# Altium footprint library S61.PcbLib: 50 footprints (part 3 of 4)
Each footprint in its own frame and in the unit in brackets; x right, y up, seen from the top. Pads: shape width x height; smd on the part's side, far side on the other; paste and mask are expansions set on the pad; w line width, h text height; cw(c..) or ccw(c..) is an arc to the next point about the centre after c.
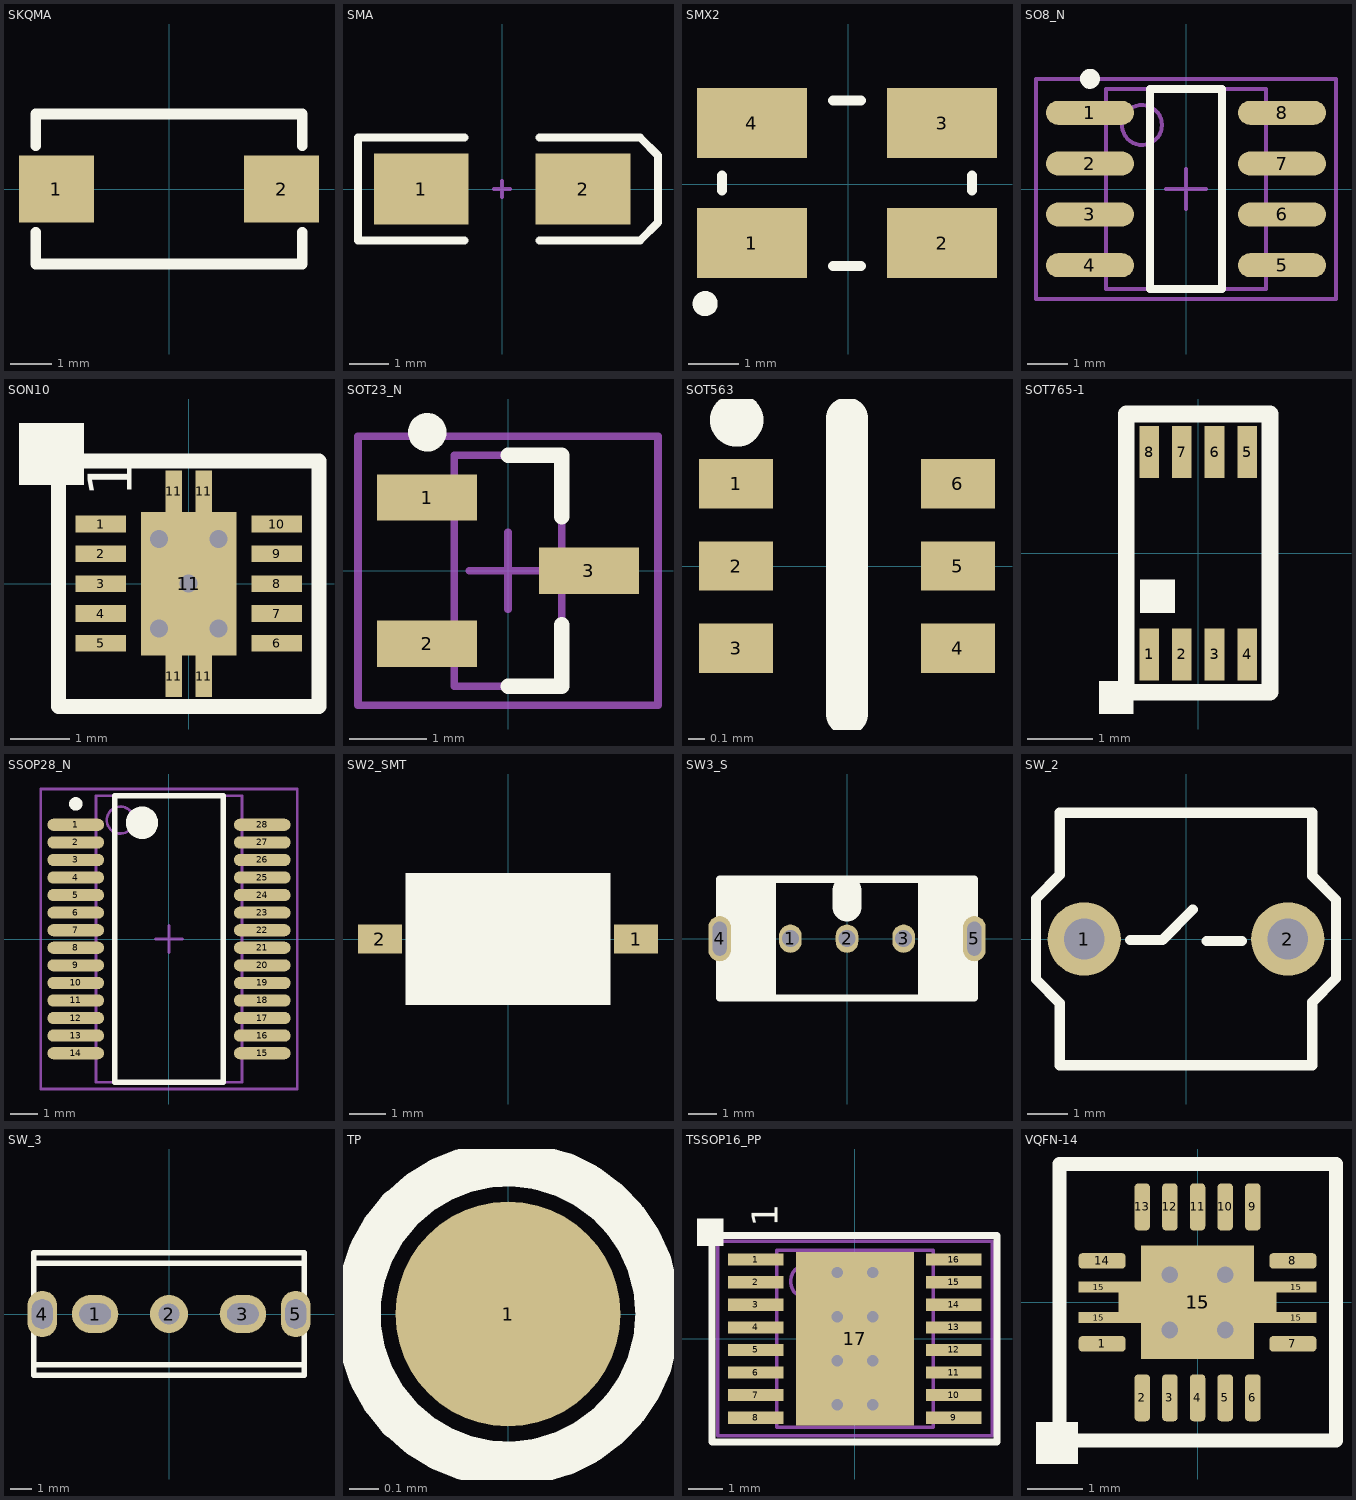
[diagram p2: the footprints below, top view; thin cyan lines are the x and y axes]

## SKQMA [mm]
height 5
pads (2):
  rect 1.8x1.6 smd: 1(-2.7,0) 2(2.7,0)
Top Overlay:
  lines w0.254: -3.2,-1.041 -3.2,-1.8 3.2,-1.8 3.2,-1.041 ; -3.2,1.041 -3.2,1.8 3.2,1.8 3.2,1.041

## SMA [mm] "DO-214-AC/SMA; 2 C-Bend Leads; Body 5 x 2.7 mm, inc. leads (LxW)"
height 2.44
pads (2):
  rect 2.4x1.8 smd: 1(-2.05,0) 2(2.05,0)
Top Overlay:
  lines w0.2: -0.95,-1.3 -3.65,-1.3 -3.65,1.3 -0.95,1.3 ; 0.95,-1.3 3.5,-1.3 3.95,-0.85 3.95,0.85 3.5,1.3 0.95,1.3
Mechanical 1:
  lines w0.1: -0.2,0 0.2,0 ; 0,-0.2 0,0.2
3D body: height 2.44, standoff 0, extent -3.352,-1.002 3.352,1.002

## SMX2 [mm]
pads (4):
  rect 2.2x1.4 smd: 1(-1.925,-1.175) 2(1.875,-1.175) 3(1.875,1.225) 4(-1.925,1.225)
Top Overlay:
  circle w0.25: c-2.862,-2.384 r0.125
  lines w0.2: -2.525,-0.125 -2.525,0.175 ; -0.304,-1.628 0.254,-1.628 ; -0.304,1.678 0.254,1.678 ; 2.475,-0.125 2.475,0.175
3D body: height 1, standoff 0, extent -2.87,-1.727 2.819,1.778

## SO8_N [mm] "SOIC, 8-Leads, Body 4.9x3.9mm, Pitch 1.27mm, IPC Medium Density"
height 1.75
pads (8):
  oval 2.2x0.6 smd: 1(-2.4,1.905) 2(-2.4,0.635) 3(-2.4,-0.635) 4(-2.4,-1.905) 5(2.4,-1.905) 6(2.4,-0.635) 7(2.4,0.635) 8(2.4,1.905)
Top Overlay:
  circle w0.25: c-2.4,2.755 r0.125
  lines w0.2: -0.9,-2.5 0.9,-2.5 0.9,2.5 -0.9,2.5 -0.9,-2.5
Mechanical 13:
  circle w0.1: c-1.1,1.6 r0.5
  lines w0.1: -2,-2.5 2,-2.5 2,2.5 -2,2.5 -2,-2.5
Mechanical 15:
  lines w0.1: -0.5,0 0.5,0 ; 0,-0.5 0,0.5 ; -3.75,-2.75 3.75,-2.75 3.75,2.75 -3.75,2.75 -3.75,-2.75
3D body: height 1.75, standoff 0, extent -2,-2.5 2,2.5

## SON10 [mm]
pads (15):
  rect 0.85x0.28 smd paste+0.07 mask+0.07: 1(-1.475,1) 2(-1.475,0.5) 3(-1.475,0) 4(-1.475,-0.5) 5(-1.475,-1) 6(1.475,-1) 7(1.475,-0.5) 8(1.475,0) 9(1.475,0.5) 10(1.475,1)
  rect 0.28x0.7 smd paste+0 mask+0: 11(-0.25,-1.549) 11(-0.25,1.549) 11(0.25,-1.549) 11(0.25,1.549)
  rect 1.6x2.4 smd paste+0 mask+0: 11(0,0)
via 0.5,0.75 diameter 0.6 hole 0.3
via -0.5,0.75 diameter 0.6 hole 0.3
via 0.5,-0.75 diameter 0.6 hole 0.3
via -0.5,-0.75 diameter 0.6 hole 0.3
via 0,0 diameter 0.6 hole 0.3
Top Overlay:
  rectangle: -2.845,1.651 -1.753,2.692
  lines w0.254: -2.184,-2.057 2.184,-2.057 2.184,2.057 -2.184,2.057 -2.184,-2.057
  text "1" at -0.711,1.448 h1.27
3D body: height 0.8, standoff 0, extent -1.97,-1.899 1.97,1.899

## SOT23_N [mm] "SOT23, 3-Leads, Body 2.9x1.3mm, Pitch 0.95mm, Lead Span 2.3mm, IPC Medium Density"
height 1.1
pads (3):
  rect 1.3x0.6 smd: 1(-1.05,0.95) 2(-1.05,-0.95) 3(1.05,0)
Top Overlay:
  circle w0.25: c-1.05,1.8 r0.125
  lines w0.2: 0,-1.5 0.7,-1.5 0.7,-0.7 ; 0,1.5 0.7,1.5 0.7,0.7
Mechanical 13:
  lines w0.1: -0.7,-1.5 0.7,-1.5 0.7,1.5 -0.7,1.5 -0.7,-1.5
Mechanical 15:
  lines w0.1: -0.5,0 0.5,0 ; 0,-0.5 0,0.5 ; -1.95,-1.75 1.95,-1.75 1.95,1.75 -1.95,1.75 -1.95,-1.75
3D body: height 1.1, standoff 0, extent -0.7,-1.5 0.7,1.5

## SOT563 [mm]
pads (6):
  rect 0.45x0.3 smd paste+0.05 mask+0.05: 1(-0.675,0.5) 2(-0.675,0) 3(-0.675,-0.5) 4(0.675,-0.5) 5(0.675,0) 6(0.675,0.5)
Top Overlay:
  circle w0.254: c-0.671,0.889 r0.036
  lines w0.254: 0,-0.9 0,0.9

## SOT765-1 [mm]
pads (8):
  rect 0.3x0.8 smd: 1(-0.75,-1.55) 2(-0.25,-1.55) 3(0.25,-1.55) 4(0.75,-1.55) 5(0.75,1.55) 6(0.25,1.55) 7(-0.25,1.55) 8(-0.75,1.55)
Top Overlay:
  rectangle: -1.524,-2.464 -0.991,-1.956
  rectangle: -0.889,-0.914 -0.356,-0.406
  lines w0.254: -1.1,-2.134 1.1,-2.134 1.1,2.134 -1.1,2.134 -1.1,-2.134

## SSOP28_N [mm] "SOP, 28-Leads, Body 10.2x5.3mm, Pitch 0.65mm, IPC Medium Density"
height 1.99
pads (28):
  oval 2.1x0.45 smd: 1(-3.45,4.225) 2(-3.45,3.575) 3(-3.45,2.925) 4(-3.45,2.275) 5(-3.45,1.625) 6(-3.45,0.975) 7(-3.45,0.325) 8(-3.45,-0.325) 9(-3.45,-0.975) 10(-3.45,-1.625) 11(-3.45,-2.275) 12(-3.45,-2.925) 13(-3.45,-3.575) 14(-3.45,-4.225) 15(3.45,-4.225) 16(3.45,-3.575) 17(3.45,-2.925) 18(3.45,-2.275) 19(3.45,-1.625) 20(3.45,-0.975) 21(3.45,-0.325) 22(3.45,0.325) 23(3.45,0.975) 24(3.45,1.625) 25(3.45,2.275) 26(3.45,2.925) 27(3.45,3.575) 28(3.45,4.225)
Top Overlay:
  circle w0.25: c-3.45,5 r0.125
  circle w0.6: c-1,4.3 r0.3
  lines w0.2: -2,-5.3 -2,5.3 2,5.3 2,-5.3 -2,-5.3
Mechanical 13:
  circle w0.1: c-1.8,4.4 r0.5
  lines w0.1: -2.7,-5.3 -2.7,5.3 2.7,5.3 2.7,-5.3 -2.7,-5.3
Mechanical 15:
  lines w0.1: -0.5,0 0.5,0 ; 0,-0.5 0,0.5 ; -4.75,-5.55 -4.75,5.55 4.75,5.55 4.75,-5.55 -4.75,-5.55
3D body: height 1.99, standoff 0, extent -2.7,-5.3 2.7,5.3

## SW2_SMT [mm]
pads (2):
  rect 1.2x0.8 smd paste+0.05 mask+0.05: 1(3.5,0) 2(-3.5,0)
Top Overlay:
  rectangle: -2.8,-1.8 2.8,1.8

## SW3_S [mm]
pads (5):
  oval 0.8x1 hole 0.6: 1(-2,0) 2(0,0) 3(2,0)
  oval 0.8x1.6 hole 0.5 slot 1.2 at 90 deg: 4(-4.5,0) 5(4.5,0)
Top Overlay:
  rectangle: 2.515,-2.21 4.572,2.134
  rectangle: -4.572,-2.159 -2.515,2.184
  lines w0.254: -4.496,-2.1 4.496,-2.1 ; -4.496,-2.083 -4.496,2.083 ; -4.496,2.1 4.496,2.1 4.496,-2.083
  lines w1.016: 0,1.118 0,1.702

## SW_2 [mm]
pads (2):
  round 1.8 hole 1: 1(-2.5,0) 2(2.5,0)
Top Overlay:
  lines w0.254: -1.372,-0.025 -0.584,-0.025 0.165,0.724 ; 0.508,-0.051 1.372,-0.051 ; -3.683,-0.992 -3.1,-1.575 -3.1,-3.1 3.1,-3.1 3.1,-1.55 3.683,-0.967 3.683,0.967 3.1,1.55 3.1,3.1 -3.1,3.1 -3.1,1.575 -3.683,0.992 -3.683,-0.992

## SW_3 [mm]
pads (5):
  oval 2.2x1.8 hole 1 slot 1.5 at 0 deg: 1(-3.5,0) 3(3.5,0)
  round 1.8 hole 1: 2(0,0)
  oval 1.4x2.2 hole 1 slot 1.4 at 90 deg: 4(-6,0) 5(6,0)
Top Overlay:
  lines w0.254: -6.4,-2.4 6.4,-2.4 ; -6.4,2.4 6.4,2.4 ; -6.4,-2.9 6.4,-2.9 6.4,2.9 -6.4,2.9 -6.4,-2.9

## TP [mil]
pads (1):
  round 30 smd paste+0 mask+4: 1(0,0)
Top Overlay:
  circle w6: c0,0 r20

## TSSOP16_PP [mm]
pads (17):
  rect 1.6x0.35 smd: 1(-2.85,2.275) 2(-2.85,1.625) 3(-2.85,0.975) 4(-2.85,0.325) 5(-2.85,-0.325) 6(-2.85,-0.975) 7(-2.85,-1.625) 8(-2.85,-2.275) 9(2.85,-2.275) 10(2.85,-1.625) 11(2.85,-0.975) 12(2.85,-0.325) 13(2.85,0.325) 14(2.85,0.975) 15(2.85,1.625) 16(2.85,2.275)
  rect 3.4x5 smd paste-0.254 mask-0.254: 17(0,0)
via -0.508,1.905 diameter 0.65 hole 0.33
via 0.508,1.905 diameter 0.65 hole 0.33
via 0.508,0.635 diameter 0.65 hole 0.33
via -0.508,0.635 diameter 0.65 hole 0.33
via -0.508,-1.905 diameter 0.65 hole 0.33
via 0.508,-1.905 diameter 0.65 hole 0.33
via -0.508,-0.635 diameter 0.65 hole 0.33
via 0.508,-0.635 diameter 0.65 hole 0.33
Top Overlay:
  rectangle: -4.547,2.667 -3.785,3.454
  lines w0.2: -4.115,-2.972 -4.115,2.972 4.089,2.972 4.089,-2.972 -4.115,-2.972
  text "1" at -1.981,3.226 h1.27
Mechanical 13:
  circle w0.1: c-1.35,1.65 r0.5
  lines w0.1: -2.25,-2.55 -2.25,2.55 2.25,2.55 2.25,-2.55 -2.25,-2.55
Mechanical 15:
  lines w0.1: -0.5,0 0.5,0 ; 0,-0.5 0,0.5 ; -3.95,-2.8 -3.95,2.8 3.95,2.8 3.95,-2.8 -3.95,-2.8
3D body: height 1.2, standoff 0, extent -2.25,-2.55 2.25,2.55

## VQFN-14 [mm]
pads (20):
  rrect50% 0.85x0.28 smd paste+0.07 mask+0.07: 1(-1.725,-0.75) 7(1.725,-0.75) 8(1.725,0.75) 14(-1.725,0.75)
  rrect50% 0.28x0.85 smd paste+0.07 mask+0.07: 2(-1,-1.725) 3(-0.5,-1.725) 4(0,-1.725) 5(0.5,-1.725) 6(1,-1.725) 9(1,1.725) 10(0.5,1.725) 11(0,1.725) 12(-0.5,1.725) 13(-1,1.725)
  rect 0.725x0.2 smd paste+0.07 mask+0.07: 15(-1.788,-0.275) 15(-1.788,0.275) 15(1.788,-0.275) 15(1.788,0.275)
  rect 2.05x2.05 smd paste+0.07 mask+0.07: 15(0,0)
  rect 2.85x0.749 smd paste+0.05 mask+0.05: 15(0,0)
via 0.5,-0.5 diameter 0.5 hole 0.3
via -0.5,-0.5 diameter 0.5 hole 0.3
via 0.5,0.5 diameter 0.5 hole 0.3
via -0.5,0.5 diameter 0.5 hole 0.3
Top Overlay:
  rectangle: -2.921,-2.921 -2.159,-2.159
  lines w0.254: 2.5,-2.5 -2.5,-2.5 -2.5,2.5 2.5,2.5 ; 2.504,-2.5 2.504,2.5